# Altium schematic symbol library altera-stratix-iv.SCHLIB: 38 symbols (part 10 of 21)
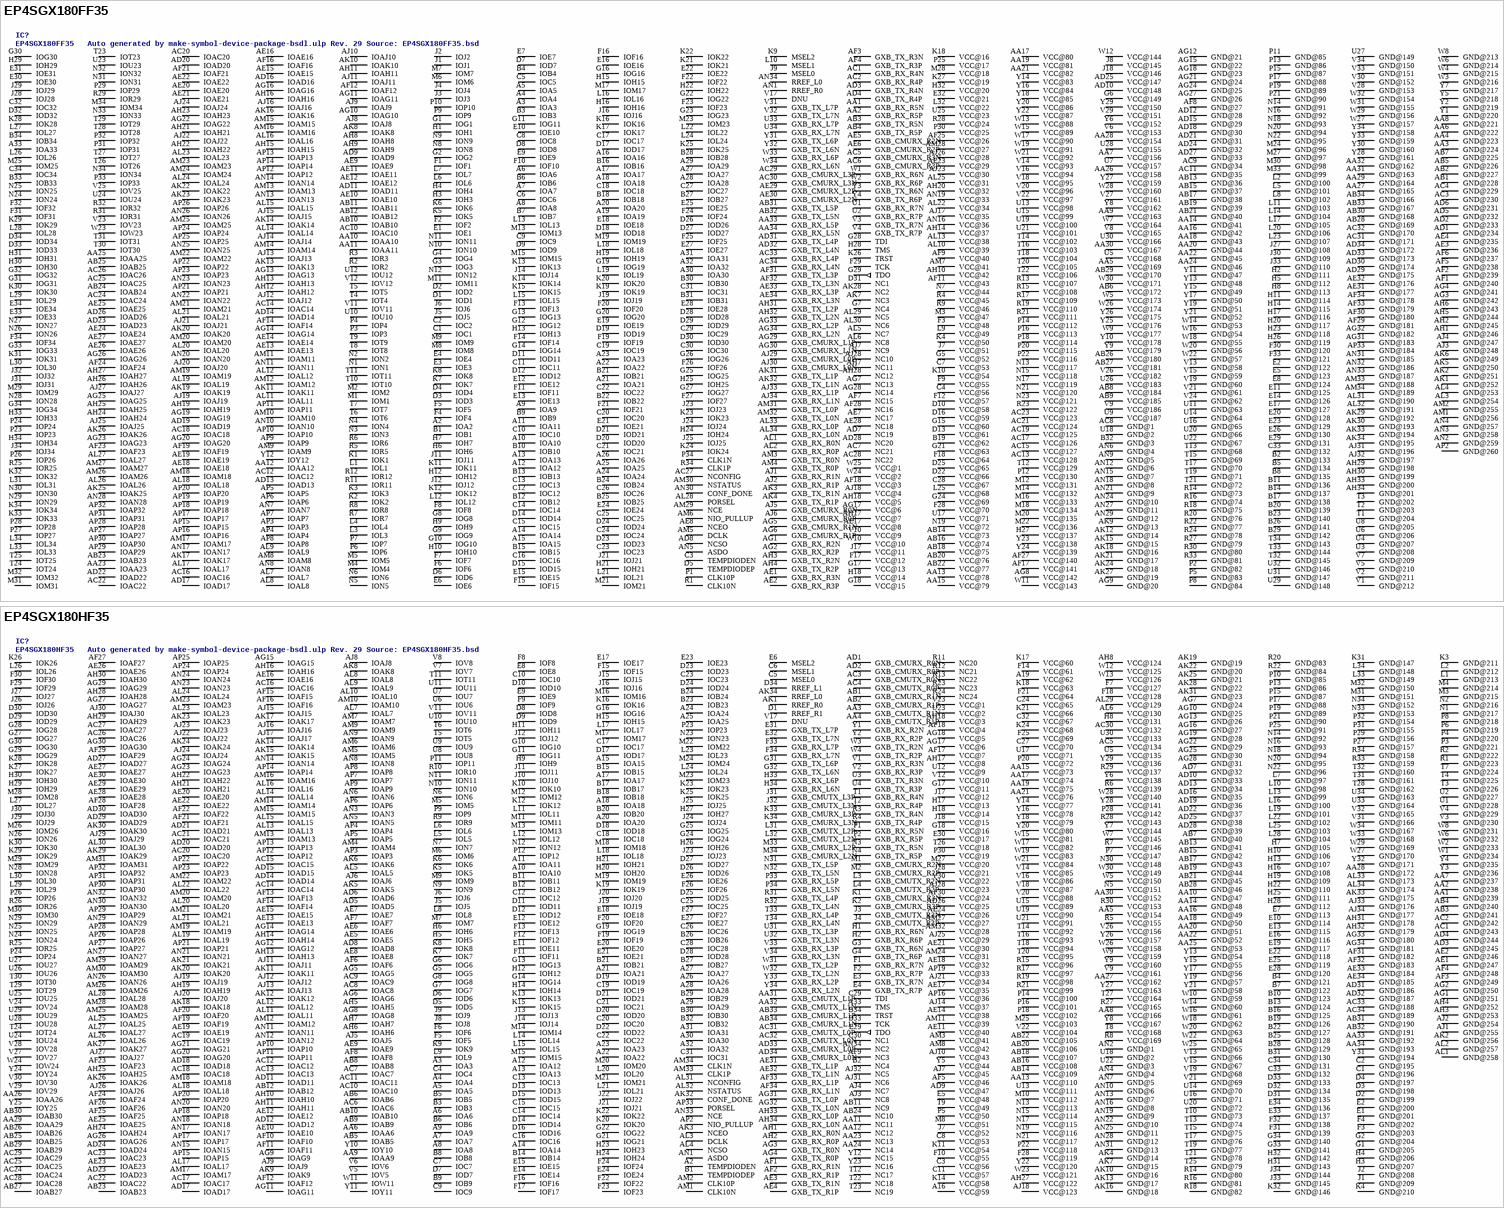
[diagram p25: symbols EP4SGX180FF35 to EP4SGX180HF35]

## EP4SGX180HF35
designator IC?, comment EP4SGX180HF35   Auto generated by make-symbol-device-package-bsdl.ulp Rev. 29 Source: EP4SGX180HF35.bsd
MPN: EP4SGX180HF35C2N
footprint FBGA1152
pins: A2 TEMPDIODEN, A3 IOA3, A4 IOA4, A5 IOA5, A6 IOA6, A7 IOA7, A8 IOA8, A9 IOA9, A10 IOA10, A11 IOA11, A12 IOA12, A13 IOA13, A14 IOA14, A15 IOA15, A16 VCC@59 (power), A17 IOA17, A18 IOA18, A19 VCC@62 (power), A20 IOA20, A21 IOA21, A22 IOA22, A23 IOA23, A24 IOA24, A25 IOA25, A26 IOA26, A27 IOA27, A28 IOA28, A29 IOA29, A30 IOA30, A31 IOA31, A32 IOA32, A33 TMS, AA1 GND@239 (power), AA2 GND@238 (power), AA3 GXB_CMUTX_R1N, AA4 GXB_CMUTX_R1P, AA5 VCC@154 (power), AA6 IOAA6, AA7 GND@237 (power), AA8 VCC@166 (power), AA9 IOAA9, AA10 GND@47 (power), AA11 NC11, AA12 NC12, AA13 VCC@110 (power), AA14 GND@48 (power), AA15 VCC@73 (power), AA16 GND@49 (power), AA17 VCC@74 (power), AA18 GND@50 (power), AA19 VCC@75 (power), AA20 GND@51 (power), AA21 VCC@76 (power), AA22 GND@52 (power), AA23 NC13, AA24 NC14, AA25 GND@53 (power), AA26 IOAA26, AA27 VCC@162 (power), AA28 GND@172 (power), AA29 IOAA29, AA30 VCC@152 (power), AA31 GXB_CMUTX_L1P, AA32 GXB_CMUTX_L1N, AA33 GND@192 (power), AA34 GND@193 (power), AB1 GXB_CMURX_R1N, AB2 GXB_CMURX_R1P, AB3 GND@241 (power), AB4 GND@240 (power), AB5 IOAB5, AB6 IOAB6, AB7 GND@40 (power), AB8 IOAB8, AB9 IOAB9, AB10 IOAB10, AB11 NC9, AB12 IOAB12, AB13 GND@41 (power), AB14 VCC@109 (power), AB15 GND@42 (power), AB16 VCC@108 (power), AB17 GND@43 (power), AB18 VCC@107 (power), AB19 GND@44 (power), AB20 VCC@106 (power), AB21 GND@45 (power), AB22 VCC@105 (power), AB23 IOAB23, AB24 NC10, AB25 IOAB25, AB26 IOAB26, AB27 IOAB27, AB28 GND@46 (power), AB29 IOAB29, AB30 IOAB30, AB31 GND@190 (power), AB32 GND@191 (power), AB33 GXB_CMURX_L1P, AB34 GXB_CMURX_L1N, AC1 GND@243 (power), AC2 GND@242 (power), AC3 GXB_CMUTX_R0N, AC4 GXB_CMUTX_R0P, AC5 VCC@134 (power), AC6 IOAC6, AC7 IOAC7, AC8 IOAC8, AC9 IOAC9, AC10 IOAC10, AC11 IOAC11, AC12 IOAC12, AC13 IOAC13, AC14 IOAC14, AC15 IOAC15, AC16 IOAC16, AC17 IOAC17, AC18 IOAC18, AC19 IOAC19, AC20 IOAC20, AC21 IOAC21, AC22 IOAC22, AC23 IOAC23, AC24 IOAC24, AC25 IOAC25, AC26 IOAC26, AC27 IOAC27, AC28 IOAC28, AC29 IOAC29, AC30 VCC@132 (power), AC31 GXB_CMUTX_L0P, AC32 GXB_CMUTX_L0N, AC33 GND@188 (power), AC34 GND@189 (power), AD1 GXB_CMURX_R0N, AD2 GXB_CMURX_R0P, AD3 GND@245 (power), AD4 GND@244 (power), AD5 IOAD5, AD6 IOAD6, AD7 GND@32 (power), AD8 IOAD8, AD9 VCC@47 (power), AD10 GND@33 (power), AD11 IOAD11, AD12 IOAD12, AD13 GND@34 (power), AD14 IOAD14, AD15 IOAD15, AD16 GND@35 (power), AD17 IOAD17, AD18 IOAD18, AD19 GND@36 (power), AD20 IOAD20, AD21 IOAD21, AD22 GND@37 (power), AD23 IOAD23, AD24 IOAD24, AD25 GND@38 (power), AD26 VCC@25 (power), AD27 IOAD27, AD28 GND@39 (power), AD29 IOAD29, AD30 IOAD30, AD31 GND@186 (power), AD32 GND@187 (power), AD33 GXB_CMURX_L0P, AD34 GXB_CMURX_L0N, AE1 GND@247 (power), AE2 GND@246 (power), AE3 GXB_TX_R1N, AE4 GXB_TX_R1P, AE5 IOAE5, AE6 IOAE6, AE7 IOAE7, AE8 IOAE8, AE9 IOAE9, AE10 IOAE10, AE11 VCC@40 (power), AE12 IOAE12, AE13 IOAE13, AE14 VCC@38 (power), AE15 IOAE15, AE16 IOAE16, AE17 VCC@35 (power), AE18 VCC@32 (power), AE19 IOAE19, AE20 IOAE20, AE21 VCC@30 (power), AE22 IOAE22, AE23 IOAE23, AE24 VCC@26 (power), AE25 IOAE25, AE26 IOAE26, AE27 IOAE27, AE28 IOAE28, AE29 IOAE29, AE30 IOAE30, AE31 GXB_TX_L1P, AE32 GXB_TX_L1N, AE33 GND@184 (power), AE34 GND@185 (power), AF1 GXB_RX_R1N, AF2 GXB_RX_R1P, AF3 GND@249 (power), AF4 GND@248 (power), AF5 VCC@46 (power), AF6 IOAF6, AF7 IOAF7, AF8 IOAF8, AF9 NC3, AF10 IOAF10, AF11 IOAF11, AF12 IOAF12, AF13 IOAF13, AF14 IOAF14, AF15 IOAF15, AF16 IOAF16, AF17 VCC@7 (power), AF18 VCC@4 (power), AF19 IOAF19, AF20 IOAF20, AF21 IOAF21, AF22 IOAF22, AF23 IOAF23, AF24 IOAF24, AF25 IOAF25, AF26 IOAF26, AF27 IOAF27, AF28 IOAF28, AF29 IOAF29, AF30 VCC@24 (power), AF31 GND@182 (power), AF32 GND@183 (power), AF33 GXB_RX_L1P, AF34 GXB_RX_L1N, AG1 GND@251 (power), AG2 GND@250 (power), AG3 GXB_TX_R0N, AG4 GXB_TX_R0P, AG5 IOAG5, AG6 IOAG6, AG7 GND@24 (power), AG8 IOAG8, AG9 IOAG9, AG10 GND@25 (power), AG11 IOAG11, AG12 IOAG12, AG13 GND@26 (power), AG14 IOAG14, AG15 IOAG15, AG16 GND@27 (power), AG17 VCC@6 (power), AG18 VCC@5 (power), AG19 GND@28 (power), AG20 IOAG20, AG21 IOAG21, AG22 GND@29 (power), AG23 IOAG23, AG24 IOAG24, AG25 GND@30 (power), AG26 IOAG26, AG27 IOAG27, AG28 GND@31 (power), AG29 IOAG29, AG30 IOAG30, AG31 GXB_TX_L0P, AG32 GXB_TX_L0N, AG33 GND@180 (power), AG34 GND@181 (power), AH1 GXB_RX_R0N, AH2 GXB_RX_R0P, AH3 GND@253 (power), AH4 GND@252 (power), AH5 IOAH5, AH6 IOAH6, AH7 IOAH7, AH8 VCC@124 (power), AH10 IOAH10, AH11 IOAH11, AH13 IOAH13, AH14 IOAH14, AH16 IOAH16, AH17 VCC@8 (power), AH18 VCC@3 (power), AH19 IOAH19, AH21 IOAH21, AH22 IOAH22, AH24 IOAH24, AH25 IOAH25, AH27 VCC@122 (power), AH28 IOAH28, AH29 IOAH29, AH30 IOAH30, AH31 GND@178 (power), AH32 GND@179 (power), AH33 GXB_RX_L0P, AH34 GXB_RX_L0N, AJ1 GND@255 (power), AJ2 GND@254 (power), AJ3 NC8, AJ4 NC7, AJ5 IOAJ5, AJ6 IOAJ6, AJ7 VCC@45 (power), AJ8 IOAJ8, AJ9 IOAJ9, AJ10 VCC@43 (power), AJ11 IOAJ11, AJ12 IOAJ12, AJ13 IOAJ13, AJ14 VCC@37 (power), AJ15 IOAJ15, AJ16 IOAJ16, AJ17 IOAJ17, AJ18 VCC@123 (power), AJ19 IOAJ19, AJ20 IOAJ20, AJ21 VCC@34 (power), AJ22 IOAJ22, AJ23 IOAJ23, AJ24 IOAJ24, AJ25 VCC@29 (power), AJ26 IOAJ26, AJ27 IOAJ27, AJ28 VCC@23 (power), AJ29 IOAJ29, AJ30 IOAJ30, AJ31 NC6, AJ32 NC5, AJ33 GND@176 (power), AJ34 GND@177 (power), AK1 RREF_R0, AK2 GND@256 (power), AK3 NCEO, AK4 GND@14 (power), AK5 IOAK5, AK6 IOAK6, AK7 GND@15 (power), AK8 IOAK8, AK9 IOAK9, AK10 GND@16 (power), AK11 IOAK11, AK12 IOAK12, AK13 GND@17 (power), AK14 IOAK14, AK15 IOAK15, AK16 GND@18 (power), AK17 IOAK17, AK18 IOAK18, AK19 GND@19 (power), AK20 IOAK20, AK21 IOAK21, AK22 GND@20 (power), AK23 IOAK23, AK24 IOAK24, AK25 GND@21 (power), AK26 IOAK26, AK27 IOAK27, AK28 GND@22 (power), AK29 IOAK29, AK30 IOAK30, AK31 GND@23 (power), AK32 CONF_DONE, AK33 GND@175 (power), AK34 RREF_L0, AL1 GND@258 (power), AL2 GND@257 (power), AL3 DCLK, AL4 NCSO, AL5 IOAL5, AL6 VCC@130 (power), AL7 IOAL7, AL8 IOAL8, AL9 IOAL9, AL10 IOAL10, AL11 IOAL11, AL12 IOAL12, AL13 IOAL13, AL14 IOAL14, AL15 IOAL15, AL16 IOAL16, AL17 IOAL17, AL18 IOAL18, AL19 IOAL19, AL20 IOAL20, AL21 IOAL21, AL22 IOAL22, AL23 IOAL23, AL24 IOAL24, AL25 IOAL25, AL26 IOAL26, AL27 IOAL27, AL28 IOAL28, AL29 VCC@129 (power), AL30 IOAL30, AL31 NCONFIG, AL32 NSTATUS, AL33 GND@173 (power), AL34 GND@174 (power), AM1 CLK10N, AM2 CLK10P, AM3 VCC@41 (power), AM4 IOAM4, AM5 IOAM5, AM6 IOAM6, AM7 IOAM7, AM8 VCC@42 (power), AM9 IOAM9, AM10 IOAM10, AM11 VCC@39 (power), AM12 IOAM12, AM13 IOAM13, AM14 IOAM14, AM15 IOAM15, AM16 IOAM16, AM17 IOAM17, AM18 IOAM18, AM19 IOAM19, AM20 IOAM20, AM21 IOAM21, AM22 IOAM22, AM23 IOAM23, AM24 VCC@31 (power), AM25 IOAM25, AM26 IOAM26, AM27 VCC@27 (power), AM28 IOAM28, AM29 IOAM29, AM30 IOAM30, AM31 IOAM31, AM32 VCC@28 (power), AM33 CLK1P, AM34 CLK1N, AN1 ASDO, AN2 GND@1 (power), AN3 IOAN3, AN4 GND@4 (power), AN5 IOAN5, AN6 IOAN6, AN7 GND@5 (power), AN8 IOAN8, AN9 IOAN9, AN10 GND@6 (power), AN11 IOAN11, AN12 IOAN12, AN13 GND@7 (power), AN14 IOAN14, AN15 IOAN15, AN16 GND@8 (power), AN17 IOAN17, AN18 IOAN18, AN19 GND@9 (power), AN20 IOAN20, AN21 IOAN21, AN22 GND@10 (power), AN23 IOAN23, AN24 IOAN24, AN25 GND@11 (power), AN26 IOAN26, AN27 IOAN27, AN28 GND@12 (power), AN29 IOAN29, AN30 IOAN30, AN31 GND@13 (power), AN32 IOAN32, AN33 NCE, AN34 NC2, AP2 NIO_PULLUP, AP3 IOAP3, AP4 IOAP4, AP5 IOAP5, AP6 IOAP6, AP7 IOAP7, AP8 IOAP8, AP9 IOAP9, AP10 IOAP10, AP11 IOAP11, AP12 IOAP12, AP13 IOAP13, AP14 IOAP14, AP15 IOAP15, AP16 VCC@36 (power), AP17 IOAP17, AP18 IOAP18, AP19 VCC@33 (power), AP20 IOAP20, AP21 IOAP21, AP22 IOAP22, AP23 IOAP23, AP24 IOAP24, AP25 IOAP25, AP26 IOAP26, AP27 IOAP27, AP28 IOAP28, AP29 IOAP29, AP30 IOAP30, AP31 IOAP31, AP32 IOAP32, AP33 PORSEL, B1 TEMPDIODEP, B2 NC4, B3 IOB3, B4 GND@121 (power), B5 IOB5, B6 IOB6, B7 GND@122 (power), B8 IOB8, B9 IOB9, B10 GND@123 (power), B11 IOB11, B12 IOB12, B13 GND@124 (power), B14 IOB14, B15 IOB15, B16 GND@125 (power), B17 IOB17, B18 IOB18, B19 GND@126 (power), B20 IOB20, B21 IOB21, B22 GND@127 (power), B23 IOB23, B24 IOB24, B25 GND@128 (power), B26 IOB26, B27 IOB27, B28 GND@129 (power), B29 IOB29, B30 IOB30, B31 GND@130 (power), B32 IOB32, B33 TCK, B34 TRST, C1 GND@196 (power), C2 GND@195 (power), C3 VCC@56 (power), C4 IOC4, C5 MSEL0, C6 MSEL1, C7 IOC7, C8 VCC@53 (power), C9 IOC9, C10 IOC10, C11 VCC@57 (power), C12 IOC12, C13 IOC13, C14 IOC14, C15 IOC15, C16 IOC16, C17 IOC17, C18 IOC18, C19 IOC19, C20 IOC20, C21 IOC21, C22 IOC22, C23 IOC23, C24 VCC@65 (power), C25 IOC25, C26 IOC26, C27 VCC@70 (power), C28 IOC28, C29 TDI, C30 NC1, C31 IOC31, C32 VCC@67 (power), C33 GND@132 (power), C34 GND@131 (power), D1 RREF_R1, D2 GND@199 (power), D3 GND@198 (power), D4 GND@197 (power), D5 IOD5, D6 IOD6, D7 IOD7, D8 IOD8, D9 IOD9, D10 IOD10, D11 IOD11, D12 IOD12, D13 IOD13, D14 IOD14, D15 IOD15, D16 IOD16, D17 IOD17, D18 IOD18, D19 IOD19, D20 IOD20, D21 IOD21, D22 IOD22, D23 IOD23, D24 IOD24, D25 IOD25, D26 IOD26, D27 IOD27, D28 IOD28, D29 IOD29, D30 IOD30, D31 GND@135 (power), D32 GND@134 (power), D33 GND@133 (power), D34 RREF_L1, E1 GND@201 (power), E2 GND@200 (power), E3 GXB_TX_R7N, E4 GXB_TX_R7P, E5 VCC@48 (power), E6 MSEL2, E7 GND@113 (power), E8 IOE8, E9 IOE9, E10 GND@114 (power), E11 IOE11, E12 IOE12, E13 GND@115 (power), E14 IOE14, E15 IOE15, E16 GND@116 (power), E17 IOE17, E18 IOE18, E19 GND@117 (power), E20 IOE20, E21 IOE21, E22 GND@118 (power), E23 IOE23, E24 IOE24, E25 GND@119 (power), E26 IOE26, E27 IOE27, E28 GND@120 (power), E29 TDO (out), E30 VCC@17 (power), E31 GXB_TX_L7P, E32 GXB_TX_L7N, E33 GND@137 (power), E34 GND@136 (power), F1 GXB_RX_R7N, F2 GXB_RX_R7P, F3 GND@203 (power), F4 GND@202 (power), F5 IOF5, F6 IOF6, F7 VCC@127 (power), F8 IOF8, F9 IOF9, F10 VCC@55 (power), F11 IOF11, F12 IOF12, F13 IOF13, F14 VCC@61 (power), F15 IOF15, F16 IOF16, F17 IOF17, F18 VCC@128 (power), F19 IOF19, F20 IOF20, F21 VCC@64 (power), F22 IOF22, F23 IOF23, F24 IOF24, F25 VCC@69 (power), F26 IOF26, F27 IOF27, F28 VCC@119 (power), F29 IOF29, F30 IOF30, F31 GND@139 (power), F32 GND@138 (power), F33 GXB_RX_L7P, F34 GXB_RX_L7N, G1 GND@205 (power), G2 GND@204 (power), G3 GXB_TX_R6N, G4 GXB_TX_R6P, G5 IOG5, G6 IOG6, G7 IOG7, G8 IOG8, G10 IOG10, G11 IOG11, G13 IOG13, G14 IOG14, G16 IOG16, G17 VCC@11 (power), G18 VCC@16 (power), G19 IOG19, G21 IOG21, G22 IOG22, G24 IOG24, G25 IOG25, G27 IOG27, G28 IOG28, G29 IOG29, G30 IOG30, G31 GXB_TX_L6P, G32 GXB_TX_L6N, G33 GND@141 (power), G34 GND@140 (power), H1 GXB_RX_R6N, H2 GXB_RX_R6P, H3 GND@207 (power), H4 GND@206 (power), H5 IOH5, H6 IOH6, H7 GND@105 (power), H8 VCC@131 (power), H9 IOH9, H10 GND@106 (power), H11 IOH11, H12 IOH12, H13 GND@107 (power), H14 IOH14, H15 IOH15, H16 GND@108 (power), H17 VCC@13 (power), H18 VCC@14 (power), H19 GND@109 (power), H20 IOH20, H21 IOH21, H22 GND@110 (power), H23 IOH23, H24 IOH24, H25 GND@111 (power), H26 IOH26, H27 IOH27, H28 GND@112 (power), H29 IOH29, H30 IOH30, H31 GND@143 (power), H32 GND@142 (power), H33 GXB_RX_L6P, H34 GXB_RX_L6N, J1 GND@209 (power), J2 GND@208 (power), J3 GXB_CMUTX_R3N, J4 GXB_CMUTX_R3P, J5 IOJ5, J6 IOJ6, J7 VCC@52 (power), J8 IOJ8, J9 IOJ9, J10 IOJ10, J11 IOJ11, J12 IOJ12, J13 IOJ13, J14 IOJ14, J15 IOJ15, J16 IOJ16, J17 VCC@12 (power), J18 VCC@15 (power), J19 IOJ19, J20 IOJ20, J21 IOJ21, J22 IOJ22, J23 IOJ23, J24 IOJ24, J25 IOJ25, J26 IOJ26, J27 IOJ27, J28 VCC@21 (power), J29 IOJ29, J30 IOJ30, J31 GXB_CMUTX_L3P, J32 GXB_CMUTX_L3N, J33 GND@145 (power), J34 GND@144 (power), K1 GXB_CMURX_R3N, K2 GXB_CMURX_R3P, K3 GND@211 (power), K4 GND@210 (power), K5 IOK5, K6 IOK6, K7 IOK7, K8 IOK8, K9 IOK9, K10 IOK10, K11 VCC@54 (power), K12 IOK12, K13 IOK13, K14 VCC@58 (power), K15 IOK15, K16 IOK16, K17 VCC@60 (power), K18 VCC@63 (power), K19 IOK19, K20 IOK20, K21 VCC@66 (power), K22 IOK22, K23 IOK23, K24 VCC@68 (power), K25 IOK25, K26 IOK26, K27 IOK27, K28 IOK28, K29 IOK29, K30 IOK30, K31 GND@147 (power), K32 GND@146 (power), K33 GXB_CMURX_L3P, K34 GXB_CMURX_L3N, L1 GND@213 (power), L2 GND@212 (power), L3 GXB_CMUTX_R2N, L4 GXB_CMUTX_R2P, L5 IOL5, L6 IOL6, L7 GND@97 (power), L8 IOL8, L9 IOL9, L10 GND@98 (power), L11 IOL11, L12 IOL12, L13 GND@99 (power), L14 IOL14, L15 IOL15, L16 GND@100 (power), L17 IOL17, L18 IOL18, L19 GND@101 (power), L20 IOL20, L21 IOL21, L22 GND@102 (power), L23 IOL23, L24 IOL24, L25 GND@103 (power), L26 IOL26, L27 IOL27, L28 GND@104 (power), L29 IOL29, L30 IOL30, L31 GXB_CMUTX_L2P, L32 GXB_CMUTX_L2N, L33 GND@149 (power), L34 GND@148 (power), M1 GXB_CMURX_R2N, M2 GXB_CMURX_R2P, M3 GND@215 (power), M4 GND@214 (power), M5 IOM5, M6 IOM6, M7 IOM7, M8 VCC@51 (power), M9 IOM9, M10 VCC@112 (power), M11 IOM11, M12 IOM12, M13 IOM13, M14 IOM14, M15 IOM15, M16 IOM16, M17 IOM17, M18 IOM18, M19 IOM19, M20 IOM20, M21 IOM21, M22 IOM22, M23 IOM23, M24 IOM24, M25 VCC@103 (power), M26 IOM26, M27 VCC@20 (power), M28 IOM28, M29 IOM29, M30 IOM30, M31 GND@151 (power), M32 GND@150 (power), M33 GXB_CMURX_L2P, M34 GXB_CMURX_L2N, N1 GND@217 (power), N2 GND@216 (power), N3 GXB_TX_R5N, N4 GXB_TX_R5P, N5 VCC@151 (power), N6 ION6, N7 ION7, N9 ION9, N10 ION10, N11 ION11, N12 ION12, N13 VCC@113 (power), N14 GND@92 (power), N15 VCC@114 (power), N16 GND@93 (power), N17 VCC@115 (power), N18 GND@94 (power), N19 VCC@116 (power), N20 GND@95 (power), N21 VCC@117 (power), N22 GND@96 (power), N23 ION23, N24 ION24, N25 ION25, N26 ION26, N28 ION28, N29 ION29, N30 VCC@148 (power), N31 GXB_TX_L5P, N32 GXB_TX_L5N, N33 GND@153 (power), N34 GND@152 (power), P1 GXB_RX_R5N, P2 GXB_RX_R5P, P3 GND@221 (power), P4 GND@220 (power), P5 VCC@50 (power), P6 GND@219 (power), P7 VCC@147 (power), P8 GND@218 (power), P9 IOP9, P10 GND@85 (power), P11 IOP11, P12 IOP12, P13 GND@86 (power), P14 VCC@100 (power), P15 GND@87 (power), P16 VCC@101 (power), P17 GND@88 (power), P18 VCC@102 (power), P19 GND@89 (power), P20 VCC@72 (power), P21 GND@90 (power), P22 VCC@118 (power), P23 IOP23, P24 IOP24, P25 GND@91 (power), P26 IOP26, P27 GND@157 (power), P28 VCC@142 (power), P29 GND@156 (power), P30 VCC@19 (power), P31 GND@155 (power), P32 GND@154 (power), P33 GXB_RX_L5P, P34 GXB_RX_L5N, R1 GND@223 (power), R2 GND@222 (power), R3 GXB_TX_R4N, R4 GXB_TX_R4P, R5 VCC@155 (power), R6 VCC@139 (power), R7 VCC@146 (power), R8 VCC@169 (power), R9 IOR9, R10 IOR10, R11 NC20, R12 NC21, R13 NC22, R14 GND@80 (power), R15 VCC@96 (power), R16 GND@81 (power), R17 VCC@97 (power), R18 GND@82 (power), R19 VCC@98 (power), R20 GND@83 (power), R21 VCC@99 (power), R22 GND@84 (power), R23 NC23, R24 NC24, R25 IOR25, R26 IOR26, R27 VCC@165 (power), R28 VCC@143 (power), R29 VCC@137 (power), R30 VCC@153 (power), R31 GXB_TX_L4P, R32 GXB_TX_L4N, R33 GND@159 (power), R34 GND@158 (power), T1 GXB_RX_R4N, T2 GXB_RX_R4P, T3 GND@226 (power), T4 GND@225 (power), T5 IOT5, T6 IOT6, T7 GND@224 (power), T8 VCC@168 (power), T9 VCC@49 (power), T10 GND@73 (power), T11 IOT11, T12 NC17, T13 GND@74 (power), T14 VCC@92 (power), T15 GND@75 (power), T16 VCC@93 (power), T17 GND@76 (power), T18 VCC@94 (power), T19 GND@77 (power), T20 VCC@95 (power), T21 GND@78 (power), T22 NC18, T23 NC19, T24 IOT24, T25 GND@79 (power), T26 VCC@18 (power), T27 VCC@164 (power), T28 GND@162 (power), T29 IOT29, T30 IOT30, T31 GND@161 (power), T32 GND@160 (power), T33 GXB_RX_L4P, T34 GXB_RX_L4N, U1 GND@228 (power), U2 GND@227 (power), U3 GXB_TX_R3N, U4 GXB_TX_R3P, U5 VCC@135 (power), U6 IOU6, U7 IOU7, U8 IOU8, U9 IOU9, U10 IOU10, U11 IOU11, U12 VCC@9 (power), U13 VCC@111 (power), U14 GND@70 (power), U15 VCC@89 (power), U16 GND@71 (power), U17 VCC@71 (power), U18 GND@2 (power), U19 VCC@90 (power), U20 GND@72 (power), U21 VCC@91 (power), U22 GND@3 (power), U23 VCC@2 (power), U24 IOU24, U25 IOU25, U26 IOU26, U27 IOU27, U28 IOU28, U29 IOU29, U30 VCC@133 (power), U31 GXB_TX_L3P, U32 GXB_TX_L3N, U33 GND@164 (power), U34 GND@163 (power), V1 GXB_RX_R3N, V2 GXB_RX_R3P, V3 GND@230 (power), V4 GND@229 (power), V5 IOV5, V6 IOV6, V7 IOV7, V8 IOV8, V9 VCC@161 (power), V11 IOV11, V12 VCC@10 (power), V13 GND@66 (power), V14 VCC@85 (power), V15 GND@67 (power), V16 VCC@86 (power), V17 DNU, V18 VCC@87 (power), V19 GND@68 (power), V20 VCC@88 (power), V21 GND@69 (power), V22 VCC@104 (power), V23 VCC@1 (power), V24 IOV24, V26 VCC@156 (power), V27 IOV27, V28 IOV28, V29 IOV29, V30 IOV30, V31 GND@166 (power), V32 GND@165 (power), V33 GXB_RX_L3P, V34 GXB_RX_L3N, W1 GND@234 (power), W2 GND@233 (power), W3 GXB_TX_R2N, W4 GXB_TX_R2P, W5 VCC@150 (power), W6 GND@232 (power), W7 VCC@145 (power), W8 GND@231 (power), W9 VCC@159 (power), W10 GND@59 (power), W11 IOW11, W12 VCC@125 (power), W13 VCC@126 (power), W14 GND@60 (power), W15 VCC@81 (power), W16 GND@61 (power), W17 VCC@82 (power), W18 GND@62 (power), W19 VCC@83 (power), W20 GND@63 (power), W21 VCC@84 (power), W22 GND@64 (power), W23 VCC@121 (power), W24 IOW24, W25 GND@65 (power), W26 VCC@158 (power), W27 GND@170 (power), W28 VCC@140 (power), W29 GND@169 (power), W30 VCC@149 (power), W31 GXB_TX_L2P, W32 GXB_TX_L2N, W33 GND@168 (power), W34 GND@167 (power), Y1 GXB_RX_R2N, Y2 GXB_RX_R2P, Y3 GND@236 (power), Y4 GND@235 (power), Y5 VCC@44 (power), Y6 VCC@138 (power), Y7 VCC@144 (power), Y8 VCC@167 (power), Y9 VCC@160 (power), Y10 IOY10, Y11 IOY11, Y12 NC15, Y13 GND@54 (power), Y14 VCC@77 (power), Y15 GND@55 (power), Y16 VCC@78 (power), Y17 GND@56 (power), Y18 VCC@79 (power), Y19 GND@57 (power), Y20 VCC@80 (power), Y21 GND@58 (power), Y22 VCC@120 (power), Y23 NC16, Y24 IOY24, Y25 IOY25, Y26 VCC@157 (power), Y27 VCC@163 (power), Y28 VCC@141 (power), Y29 VCC@136 (power), Y30 VCC@22 (power), Y31 GND@194 (power), Y32 GND@171 (power), Y33 GXB_RX_L2P, Y34 GXB_RX_L2N
